# Altium footprint library Atlan.PcbLib: 283 footprints (part 14 of 18)
Each footprint in its own frame and in the unit in brackets; x right, y up, seen from the top. Pads: shape width x height; smd on the part's side, far side on the other; paste and mask are expansions set on the pad; w line width, h text height; cw(c..) or ccw(c..) is an arc to the next point about the centre after c.
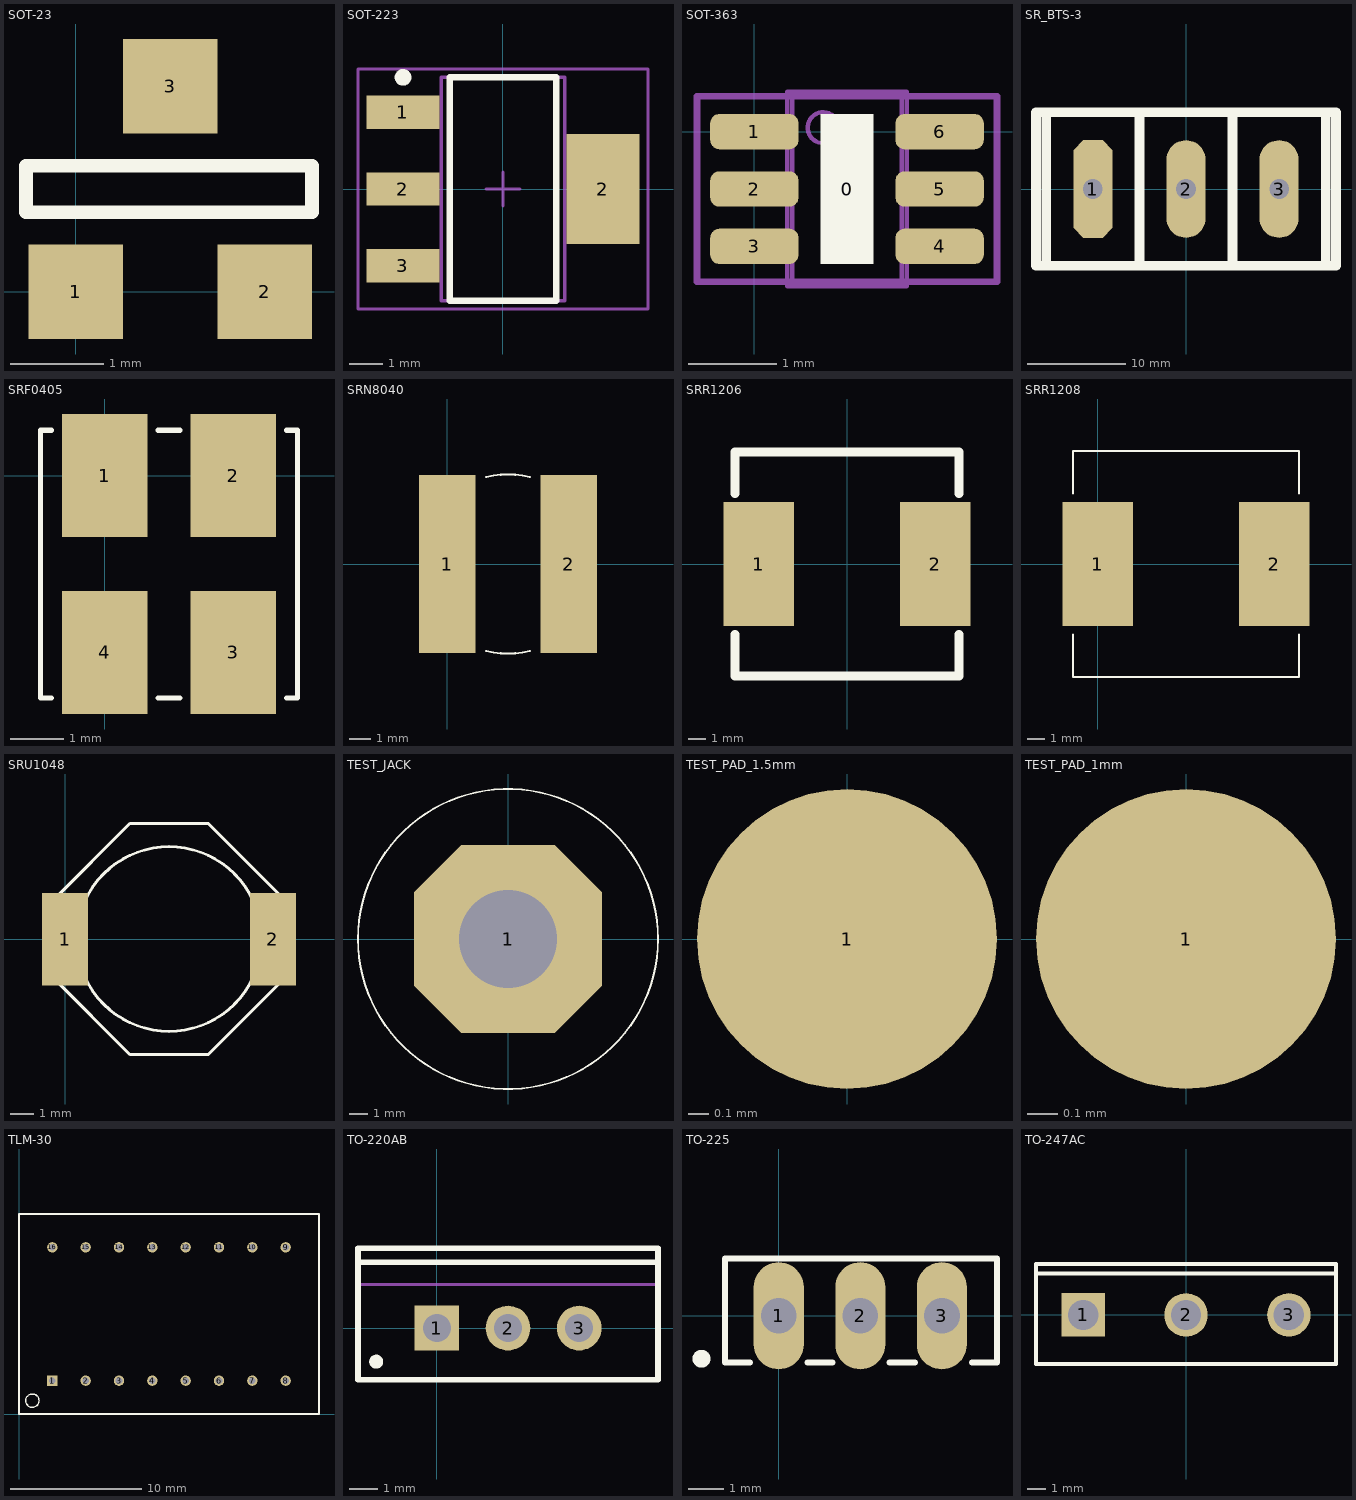
[diagram p13: the footprints below, top view; thin cyan lines are the x and y axes]

## SOT-23 [mil]
pads (3):
  rect 40x40 smd: 1(0,0) 2(80,0) 3(40,87)
Top Overlay:
  lines w5.91: -21.02,33.66 -21.02,53.34 100,53.34 100,33.66 -21.02,33.66
3D body "SOT-23.STEP": height 39.23, standoff -0.79, extent -17.89,-5.91 96.63,91.58

## SOT-223 [mm] "SOT223, 4-Leads, Body 6.5x3.5mm, Pitch 2.3mm, Lead Span 7mm, IPC Medium Density"
height 1.8
pads (4):
  rect 2.2x1 smd: 1(-3,2.3) 2(-3,0) 3(-3,-2.3)
  rect 2.2x3.3 smd: 2(3,0)
Top Overlay:
  circle w0.25: c-3,3.35 r0.125
  lines w0.2: -1.6,-3.35 -1.6,3.35 1.6,3.35 1.6,-3.35 -1.6,-3.35
Mechanical 13:
  lines w0.1: -1.85,-3.35 -1.85,3.35 1.85,3.35 1.85,-3.35 -1.85,-3.35
Mechanical 15:
  lines w0.1: -0.5,0 0.5,0 ; 0,-0.5 0,0.5 ; -4.35,-3.6 -4.35,3.6 4.35,3.6 4.35,-3.6 -4.35,-3.6
3D body: height 1.8, standoff 0, extent -1.85,-3.35 1.85,3.35

## SOT-363 [mm]
pads (7):
  round 0.5 on Mech15: 0(1.05,-0.65)
  rrect50% 1x0.4 smd: 1(0,0) 2(0,-0.65) 3(0,-1.3) 4(2.1,-1.3) 5(2.1,-0.65) 6(2.1,0)
Top Overlay:
  rectangle: 0.75,-1.5 1.35,0.2
  text "." at -0.975,0 h0.1
Top Solder:
  rectangle: -0.347,-1.412 0.415,0.112
  region: 2.447,0.112 1.685,0.112 1.685,-1.412 2.447,-1.412
Mechanical 13:
  circle w0.05: c0.78,0.045 r0.175
  lines w0.05: 0.022,-1.45 0.022,-1.15 ; 0.022,-0.8 0.022,-0.5 ; 0.022,-0.15 0.022,0.15 ; 0.113,-1.45 0.113,-1.15 ; 0.113,-0.8 0.113,-0.5 ; 0.113,-0.15 0.113,0.15 ; 0.125,-1.45 0.125,-1.15 ; 0.125,-0.8 0.125,-0.5 ; 0.125,-0.15 0.125,0.15 ; 1.975,-1.45 1.975,-1.15 ; 1.975,-0.8 1.975,-0.5 ; 1.975,-0.15 1.975,0.15 ; 1.987,-1.45 1.987,-1.15 ; 1.987,-0.8 1.987,-0.5 ; 1.987,-0.15 1.987,0.15 ; 2.078,-1.45 2.078,-1.15 ; 2.078,-0.8 2.078,-0.5 ; 2.078,-0.15 2.078,0.15 ; 0.375,-1.75 1.725,-1.75 ; 0.375,-1.75 0.375,0.45 ; 0.375,-1.75 0.431,-1.694 ; 0.375,0.45 1.725,0.45 ; 0.375,0.45 0.431,0.394 ; 0.431,-1.694 1.669,-1.694 ; 0.431,-1.694 0.431,0.394 ; 0.431,0.394 1.669,0.394 ; 1.669,-1.694 1.725,-1.75 ; 1.669,-1.694 1.669,0.394 ; 1.669,0.394 1.725,0.45 ; 1.725,-1.75 1.725,0.45 ; -0.15,-1.45 -0.15,-1.15 0.396,-1.15 0.396,-1.45 -0.15,-1.45 ; -0.15,-0.8 -0.15,-0.5 0.396,-0.5 0.396,-0.8 -0.15,-0.8 ; -0.15,-0.15 -0.15,0.15 0.396,0.15 0.396,-0.15 -0.15,-0.15 ; 1.704,-1.45 2.25,-1.45 2.25,-1.15 1.704,-1.15 1.704,-1.45 ; 1.704,-0.8 2.25,-0.8 2.25,-0.5 1.704,-0.5 1.704,-0.8 ; 1.704,-0.15 2.25,-0.15 2.25,0.15 1.704,0.15 1.704,-0.15
Mechanical 15:
  lines w0.076: -0.65,-1.7 -0.65,0.4 2.75,0.4 2.75,-1.7 -0.65,-1.7
3D body "SOT363.STEP": height 1.1, standoff 0, extent -0.15,-1.75 2.25,0.45

## SR_BTS-3 [mm]
pads (3):
  oct 4x10 hole 2: 1(-9.53,0)
  oval 4x10 hole 2: 2(0,0) 3(9.53,0)
Top Overlay:
  lines w1: -14.295,-7.85 -14.295,7.85 ; -4.765,-7.85 -4.765,7.85 ; 4.765,-7.85 4.765,7.85 ; 14.295,-7.85 14.295,7.85 ; -15.35,-7.85 -15.35,7.85 15.35,7.85 15.35,-7.85 -15.35,-7.85
3D body "387207503.stp": height 16.76, standoff -4.83, extent -15.283,-7.85 15.323,7.898

## SRF0405 [mm]
height 4.8
pads (4):
  rect 1.6x2.3 smd: 1(0,0) 2(2.4,0) 3(2.4,-3.3) 4(0,-3.3)
Top Overlay:
  lines w0.1: -1,-4.15 -1.2,-4.15 -1.2,0.85 -1,0.85 ; 1,-4.15 1.4,-4.15 ; 1,0.85 1.4,0.85 ; 3.4,-4.15 3.6,-4.15 3.6,0.85 3.4,0.85
3D body: height 4.8, standoff 0, extent -1.2,-4.1 3.6,0.8

## SRN8040 [mm]
height 4
pads (2):
  rect 2.6x8.2 smd: 1(0,0) 2(5.6,0)
Top Overlay:
  lines w0.1: 1.8,-4 ccw(c2.8,0) 3.8,-4 ; 1.8,4 cw(c2.8,0) 3.8,4
3D body: height 4, standoff 0, extent -1.2,-4 6.768,3.984

## SRR1206 [mm]
pads (2):
  rect 4x7 smd: 1(-5,0) 2(5,0)
Top Overlay:
  lines w0.5: -6.35,-4 -6.35,-6.35 6.35,-6.35 6.35,-4 ; -6.35,4 -6.35,6.35 6.35,6.35 6.35,4
3D body "SRR1206-220M.stp": height 6.25, standoff -0.25, extent -6.35,-6.35 6.35,6.35

## SRR1208 [mm]
height 8.5
pads (2):
  rect 4x7 smd: 1(0,0) 2(10,0)
Top Overlay:
  lines w0.1: -1.4,-4 -1.4,-6.4 11.4,-6.4 ; -1.4,4 -1.4,6.4 11.4,6.4 ; 11.4,-4 11.4,-6.4 ; 11.4,4 11.4,6.4 ; 11.4,-6.4 11.4,-6.4 ; 11.4,6.4 11.4,6.4
3D body: height 8.5, standoff 0, extent -1.4,-6.4 11.4,6.4

## SRU1048 [mm]
pads (2):
  rect 2x4 smd: 1(0,0) 2(9,0)
Top Overlay:
  circle w0.127: c4.502,0.006 r4
  lines w0.127: -0.498,-1.694 -0.498,1.706 2.802,5.006 6.202,5.006 9.502,1.706 9.502,-1.694 6.202,-4.994 2.802,-4.994 -0.498,-1.694
3D body "sru1048.stp": height 4.8, standoff 0, extent -0.5,-5 9.5,5

## TEST_JACK [mm]
pads (1):
  oct 10x10 hole 5.2: 1(0,0)
Top Overlay:
  circle w0.1: c0,0 r8
3D body "uticnica1.STEP": height 14.14, standoff -10.86, extent -7,-6.5 7,7.5

## TEST_PAD_1.5mm [mm]
pads (1):
  round 1.5 smd: 1(0,0)

## TEST_PAD_1mm [mm]
pads (1):
  round 1 smd: 1(0,0)

## TLM-30 [mm]
pads (16):
  rect 0.8x0.8 hole 0.5: 1(2.54,2.54)
  round 0.8 hole 0.5: 2(5.08,2.54) 3(7.62,2.54) 4(10.16,2.54) 5(12.7,2.54) 6(15.24,2.54) 7(17.78,2.54) 8(20.32,2.54) 9(20.32,12.7) 10(17.78,12.7) 11(15.24,12.7) 12(12.7,12.7) 13(10.16,12.7) 14(7.62,12.7) 15(5.08,12.7) 16(2.54,12.7)
Top Overlay:
  circle w0.1: c1.016,1.016 r0.508
  lines w0.127: 0,0 22.86,0 22.86,15.24 0,15.24 0,0
3D body: height 8, standoff 0, extent 0,0 22.86,15.24

## TO-220AB [mm]
pads (3):
  rect 1.6x1.6 hole 1: 1(0,0)
  round 1.6 hole 1: 2(2.54,0) 3(5.08,0)
Top Overlay:
  circle w0.25: c-2.16,-1.2 r0.125
  lines w0.2: -2.81,2.35 7.89,2.35 ; -2.81,-1.85 7.89,-1.85 7.89,2.85 -2.81,2.85 -2.81,-1.85
Mechanical 13:
  lines w0.1: -2.81,1.55 7.89,1.55 ; -2.81,-1.85 -2.81,2.85 7.89,2.85 7.89,-1.85 -2.81,-1.85
Mechanical 15:
  lines w0.1: 2.04,0 3.04,0 ; 2.54,-0.5 2.54,0.5
3D body: height 19.3, standoff 12.9, extent -2.809,1.551 7.889,2.849
3D body: height 12.9, standoff 4, extent -2.86,-1.9 7.94,2.9

## TO-225 [mm]
height 11
pads (3):
  oval 1.4x3 hole 1: 1(0,0) 2(2.28,0) 3(4.56,0)
Top Overlay:
  circle w0.25: c-2.16,-1.2 r0.125
  lines w0.17: -0.8,-1.3 -1.5,-1.3 -1.5,1.6 6.1,1.6 6.1,-1.3 5.4,-1.3 ; 0.8,-1.3 1.5,-1.3 ; 3.1,-1.3 3.8,-1.3
3D body: height 13, standoff 2, extent -1.4,-1.2 6,1.5

## TO-247AC [mm] "SIP with Mounting Hole; 3 Leads; Body 20 x 15.6 x 5 mm (typ); Pitch 5.45 mm"
height 24.6
pads (3):
  rect 2.3x2.3 hole 1.6: 1(-5.45,0)
  round 2.3 hole 1.6: 2(0,0) 3(5.45,0)
Top Overlay:
  lines w0.2: -7.95,2.2 7.95,2.2 ; -7.95,-2.6 7.95,-2.6 7.95,2.7 -7.95,2.7 -7.95,-2.6